# Altium footprint library myfirstproject_library.PcbLib: 36 footprints (part 3 of 3)
Each footprint in its own frame and in the unit in brackets; x right, y up, seen from the top. Pads: shape width x height; smd on the part's side, far side on the other; paste and mask are expansions set on the pad; w line width, h text height; cw(c..) or ccw(c..) is an arc to the next point about the centre after c.
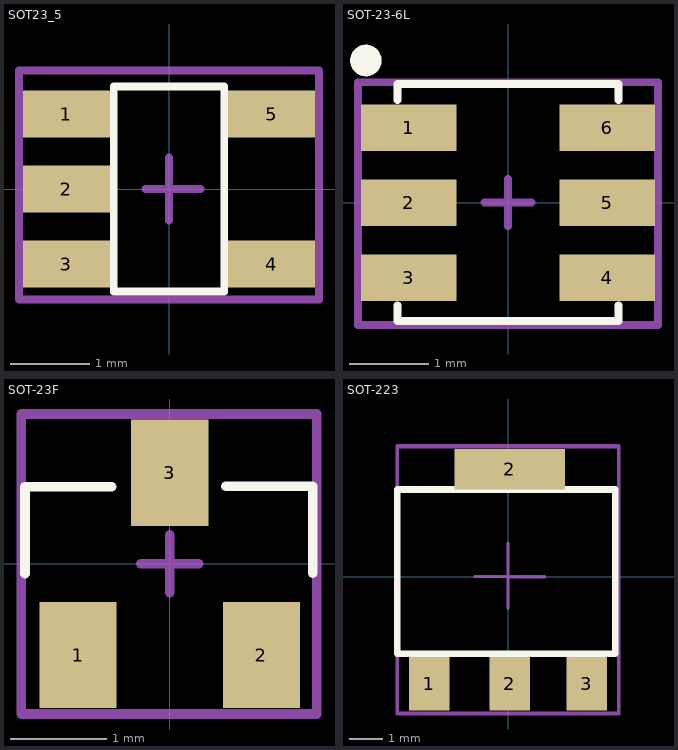
[diagram p2: the footprints below, top view; thin cyan lines are the x and y axes]

## SOT23_5 [mm]
pads (5):
  rect 1.1x0.6 smd mask+0.05: 1(-1.3,0.95) 2(-1.3,0) 3(-1.3,-0.95) 4(1.3,-0.95) 5(1.3,0.95)
Top Overlay:
  lines w0.1: -0.7,-1.3 0.7,-1.3 0.7,1.3 -0.7,1.3 -0.7,-1.3
Top Component Center:
  lines w0.1: -0.3,0 0.4,0 0,0 ; 0,0 0,-0.4 0,0.4 0,0 ; -1.9,-1.4 1.9,-1.4 1.9,1.5 -1.9,1.5 -1.9,-1.4
Top Designator:
  lines w0.1: -1.9,-1.4 1.9,-1.4 1.9,1.5 -1.9,1.5 -1.9,-1.4
  text ".Designator" at -0.4,0.3 h0.6
3D body "OPA23_5.STEP": height 1.45, standoff 0, extent -1.4,-1.45 1.4,1.45

## SOT-23-6L [mm]
pads (6):
  rect 1.21x0.59 smd mask+0.05: 1(-1.255,0.95) 2(-1.255,0) 3(-1.255,-0.95) 4(1.255,-0.95) 5(1.255,0) 6(1.255,0.95)
Top Overlay:
  circle w0.2: c-1.8,1.8 r0.1
  lines w0.1: -1.4,-1.3 -1.4,-1.5 1.4,-1.5 1.4,-1.3 ; -1.4,1.3 -1.4,1.5 1.4,1.5 1.4,1.3
Top Component Center:
  lines w0.1: -0.3,0 0.3,0 0,0 ; 0,0 0,0.3 0,-0.3 0,0 ; -1.9,-1.55 1.9,-1.55 1.9,1.525 -1.9,1.525 -1.9,0.8 -1.9,-1.55
Top Designator:
  lines w0.1: -1.9,-1.55 -1.9,0.8 -1.9,1.525 1.9,1.525 1.9,-1.55 -1.9,-1.55
  text ".Designator" at -0.5,0.5 h0.6
3D body "USBLC6-2SC6.STEP": height 1.4, standoff -0.05, extent -1.4,-1.462 1.4,1.462

## SOT-23F [mm]
pads (3):
  rect 0.8x1.1 smd mask+0.05: 1(-0.95,-0.945) 2(0.95,-0.945) 3(0,0.945)
Top Overlay:
  lines w0.1: -1.5,-0.1 -1.5,0.8 -0.6,0.8 ; 0.581,0.806 1.481,0.806 1.481,-0.094
Top Component Center:
  lines w0.1: -0.3,0 0.3,0 ; 0,-0.3 0,0.3 0,0 ; -1.54,-1.556 -1.54,1.554 -0.017,1.554 1.525,1.554 1.525,-1.556 -1.54,-1.556
Top Designator:
  lines w0.1: -1.54,-1.556 -1.54,1.554 -0.017,1.554 1.525,1.554 1.525,-1.556 -1.54,-1.556
  text ".Designator" at -1.145,-0.037 h1.52
3D body "User Library-SOT23F.STEP": height 0.91, standoff 0, extent -1.45,-1.2 1.45,1.2

## SOT-223 [mm]
pads (4):
  rect 1.2x1.6 smd mask+0.05: 1(-2.35,-3.2) 2(0.05,-3.2) 3(2.35,-3.2)
  rect 3.3x1.2 smd mask+0.05: 2(0.05,3.2)
Top Overlay:
  lines w0.2: -3.3,-2.3 3.2,-2.3 3.2,2.6 -3.3,2.6 -3.3,-2.3
Top Component Center:
  lines w0.1: -1,0 1.1,0 1.1,-0.001 0.003,-0.001 0,-0.001 0,-0.95 0,0.99 ; -3.3,-4.08 3.3,-4.08 ; -3.3,-4.08 -3.3,3.87 ; -3.3,-4.08 3.3,-4.08 ; -3.3,-4.08 -3.3,3.87 ; -3.3,3.87 3.3,3.87 ; -3.3,3.87 3.3,3.87 ; 3.3,-4.08 3.3,3.87 ; 3.3,-4.08 3.3,3.87
Top Designator:
  lines w0.1: -3.3,-4.1 3.3,-4.1 3.3,3.9 -3.3,3.9 -3.3,-4.1
  text "Designator" at -0.546,0.362 h1.52
3D body "SOT-223.step": height 1.67, standoff -0.01, extent -3.35,-3.28 3.15,3.68